# Altium schematic symbol library SCHLIB.SchLib: 2608 symbols (part 10 of 20) (continued)
## Q-MMBTA06 (continued)
footprint SOT23-3
pins: 1, 2, 3

## Q-MMBTA56LT1G
designator Q?, comment MMBTA56LT1G  Case/Package: SOT-23-3
TRANS PNP 80V 0.5A SOT23; Manufacturer: ON Semiconductor; Max Power Dissipation: 225mW; Number of Elements: 1; Frequency: 50MHz; hFE Min: 100; Emitter Base Voltage (VEBO): 4V; Max Collector Current: 500mA; Collector Emitter Breakdown Voltage: -80V; Collector Emitter Saturation Voltage: -250mV; Power Dissipation: 300mW; Element Configuration: Single; Current Rating: -500mA; Washability: OK; Supplier 1: Digi-Key; Manufacturer Part Number: MMBTA56LT1G; Stock 1: 65303; Pricing 1: 1=0.22, 10=0.203, 100=0.1106, 500=0.06806, 1000=0.0464 (USD); Number of Pins: 3; Contact Plating: Matte,Tin; Min Operating Temperature: -55°C; Max Operating Temperature: 150°C; Package Quantity: 1; Collector Emitter Voltage (VCEO): 80V; Packaging: Tape and Reel; Polarity: PNP; Transition Frequency: 50MHz; Max Breakdown Voltage: 80V; Collector Base Voltage (VCBO): 80V; Gain Bandwidth Product: 50MHz; Max Frequency: 50MHz; Voltage Rating (DC): -80V; Length: 0.119inch; Height: 0.04inch; Width: 0.055inch; Radiation Hardening: No; Lead Free: Lead Free; REACH SVHC: No SVHC; ComponentLink1URL: https://www.verical.com/server-webapp/html/getDatasheet?partID=99524; ComponentLink1Description: https://www.verical.com/server-webapp/html/getDatasheet?partID=99524; ComponentLink2URL: http://www.mouser.com/ds/2/308/MMBTA55LT1-D-112284.pdf; ComponentLink2Description: http://www.mouser.com/ds/2/308/MMBTA55LT1-D-112284.pdf; ComponentLink3URL: http://www.farnell.com/datasheets/1571910.pdf; ComponentLink3Description: http://www.farnell.com/datasheets/1571910.pdf; ComponentLink4URL: http://www.onsemi.com/pub/Collateral/MMBTA55LT1-D.PDF; ComponentLink4Description: http://www.onsemi.com/pub/Collateral/MMBTA55LT1-D.PDF; Supplier Part Number 1: MMBTA56LT1GOSDKR-ND
footprint SOT23-3
pins: 1, 2, 3

## Q-NTBLS0D7N06C
designator Q?, comment NTBLS0D7N06C
NFET TOLL 60V 0.75MO; Manufacturer: ON Semiconductor; Supplier 1: Digi-Key; Manufacturer Part Number: NTBLS0D7N06C; Stock 1: 1954; Pricing 1: 1=5,41000, 10=4,85500, 25=4,59000, 100=3,67200, 500=3,26400, 1000=2,79480 (USD); RoHS: No; Supplier 2: Digi-Key; Manufacturer Part Number 2: NTBLS0D7N06C; Stock 2: 1954; Pricing 2: 1=5,41000, 10=4,85500, 25=4,59000, 100=3,67200, 500=3,26400, 1000=2,79480 (USD); Supplier Part Number 1: 488-NTBLS0D7N06CCT-ND
footprint 8-PowerSFN
pins: 1 GATE, 2 SOURCE, 3 SOURCE, 4 SOURCE, 5 SOURCE, 6 SOURCE, 7 SOURCE, 8 SOURCE, 9 DRAIN

## Q-NTMTS0D6N04CL
designator Q?, comment NTMTS0D6N04CL
N-Channel 40V 554.5A 5W; Manufacturer: ON Semiconductor; Manufacturer Part Number: NTMTS0D6N04CLTXG; Supplier 1: Digi-Key; Stock 1: 2803; Pricing 1: 1=4,40000, 10=3,95000, 25=3,73400, 100=2,98730, 500=2,65536, 1000=2,27365 (USD); RoHS: No; Supplier Part Number 1: NTMTS0D6N04CLTXGOSCT-ND
footprint PQFN 8x8
pins: 1 G, 2 S, 3 S, 4 S, 5 D, 6 D, 7 D, 8 D

## Q-NVTFS6H850NTAG
designator Q?, comment NVTFS6H850
MOSFET N-CH 80V 68A TRENCH 8WDFN; Manufacturer: ON Semiconductor; Manufacturer Part Number: NVTFS6H850NTAG; Rds On Max: 9.5mR; Input Capacitance: 1.14nF; Max Power Dissipation: 107W; Supplier 1: Digi-Key; Supplier Part Number 1: NVTFS6H850NTAGOSCT-ND; Stock: 1154; Pricing: 1=0.93, 10=0.819, 25=0.7696, 100=0.5587, 500=0.4668 (USD); Mount: Surface Mount; Number of Pins: 8; Min Operating Temperature: -55°C; Max Operating Temperature: 175°C; Packaging: Cut Tape; Drain to Source Voltage (Vdss): 80V; Continuous Drain Current (ID): 68A; ComponentLink1URL: https://www.onsemi.com/pub/Collateral/NVTFS6H850N-D.PDF?src-supplier=Digi-Key; ComponentLink1Description: https://www.onsemi.com/pub/Collateral/NVTFS6H850N-D.PDF?src-supplier=Digi-Key; ComponentLink2URL: http://datasheet.octopart.com/NVTFS6H850NTAG-ON-Semiconductor-datasheet-139013616.pdf?src-supplier=ON+Semiconductor; ComponentLink2Description: http://datasheet.octopart.com/NVTFS6H850NTAG-ON-Semiconductor-datasheet-139013616.pdf?src-supplier=ON+Semiconductor; ComponentLink3URL: http://datasheet.octopart.com/NVTFS6H850NTAG-ON-Semiconductor-datasheet-86803066.pdf?src-supplier=ON+Semiconductor; ComponentLink3Description: http://datasheet.octopart.com/NVTFS6H850NTAG-ON-Semiconductor-datasheet-86803066.pdf?src-supplier=ON+Semiconductor; ComponentLink4URL: http://datasheet.octopart.com/NVTFS6H850NTAG-ON-Semiconductor-datasheet-101611421.pdf?src-supplier=Farnell; ComponentLink4Description: http://datasheet.octopart.com/NVTFS6H850NTAG-ON-Semiconductor-datasheet-101611421.pdf?src-supplier=Farnell
footprint 8-PowerWDFN (DFN, 8-Leads, Body 3.05x3.05mm, Pitch 0.65mm)
pins: 1 S, 2 S, 3 S, 4 G, 5 D, 6 D, 7 D, 8 D

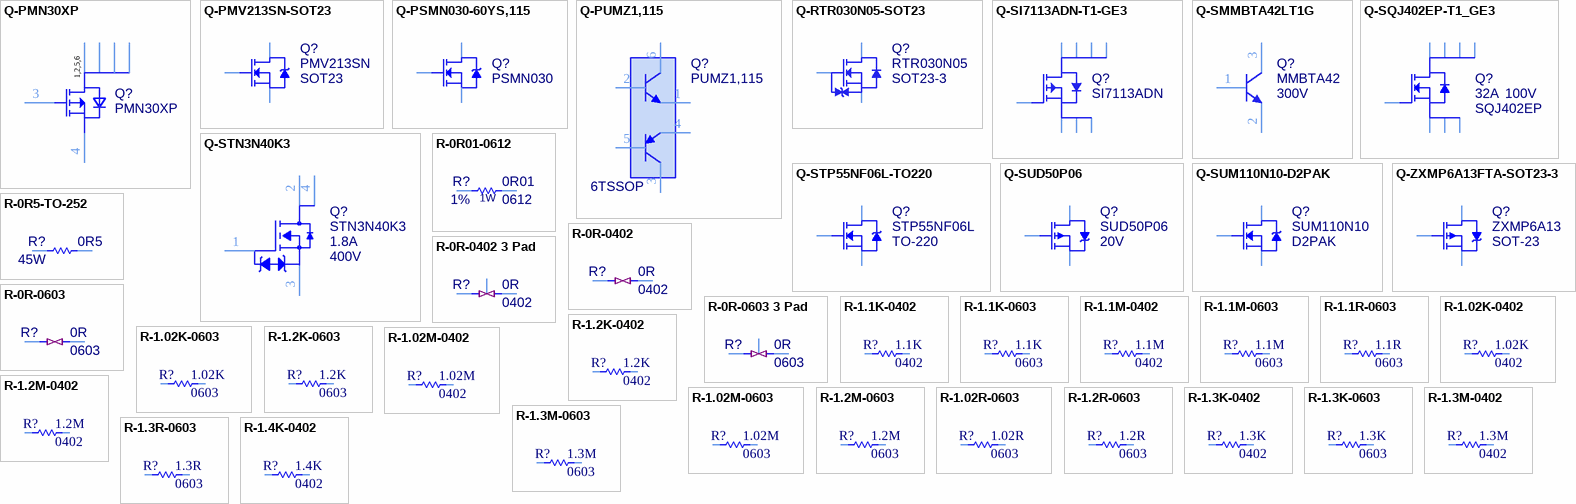
[diagram p43: symbols Q-PMN30XP to R-1.4K-0402]

## Q-PMN30XP
designator Q?, comment PMN30XP
MOSFET P-CH 20V 5.2A 6TSOP; Manufacturer: NXP Semiconductors; Manufacturer Part Number 1: PMN30XPX; Max Power Dissipation: 550mW; Rds On Max: 34mR; Input Capacitance: 1.575nF; Supplier 1: Digi-Key; Stock 1: 16739; Pricing 1: 1=0,43000, 10=0,34800, 25=0,31840, 100=0,19980, 500=0,18500, 1000=0,12580 (USD); RoHS: Yes; Mount: Surface Mount; Min Operating Temperature: -55°C; Max Operating Temperature: 150°C; Drain to Source Voltage (Vdss): 20V; Continuous Drain Current (ID): 5.2A; Packaging: Tape and Reel; ComponentLink1URL: https://assets.nexperia.com/documents/data-sheet/PMN30XP.pdf?src-supplier=Digi-Key; ComponentLink1Description: https://assets.nexperia.com/documents/data-sheet/PMN30XP.pdf?src-supplier=Digi-Key; Case/Package: TSOP; Supplier Part Number 1: 1727-2699-1-ND
footprint TSOP6
pins: 1 DRAIN, 2 DRAIN, 3 GATE, 4 SOURCE, 5 DRAIN, 6 DRAIN
text: 1,2,5,6

## Q-PMV213SN-SOT23
designator Q?, comment PMV213SN  Case/Package: SOT23
MOSFET N-CH 100V 1.9A SOT23; Manufacturer: NXP Semiconductors; Manufacturer Part Number: PMV213SN,215; Input Capacitance: 330pF; Max Power Dissipation: 2W; Rds On Max: 250mR; Rise Time: 5ns; Fall Time: 3ns; Turn-Off Delay Time: 9.5ns; Turn-On Delay Time: 5.5ns; Element Configuration: Single; Gate to Source Voltage (Vgs): 30V; Washability: OK; Supplier 1: Digi-Key; Supplier Part Number 1: 1727-6294-6-ND; Stock 1: 0; Pricing 1: 1=0.66, 10=0.557, 100=0.4181, 500=0.30658, 1000=0.23691 (USD); Number of Pins: 3; Weight: 0.01lb; Min Operating Temperature: -55°C; Max Operating Temperature: 150°C; Package Quantity: 1; Packaging: Tape and Reel; Max Dual Supply Voltage: 100V; Drain to Source Voltage (Vdss): 100V; Continuous Drain Current (ID): 1.9A; Drain to Source Breakdown Voltage: 100V; Power Dissipation: 2W; Drain to Source Resistance: 250mR; On-State Resistance: 250MR; Length: 3mm; Height: 1mm; Width: 1.4mm; Radiation Hardening: No; Lead Free: Lead Free; ComponentLink1URL: http://www.nxp.com/documents/data_sheet/PMV213SN.pdf; ComponentLink1Description: http://www.nxp.com/documents/data_sheet/PMV213SN.pdf; ComponentLink2URL: http://www.nxp.com/documents/data_sheet/PMV213SN.pdf?ecmp=mouser; ComponentLink2Description: http://www.nxp.com/documents/data_sheet/PMV213SN.pdf?ecmp=mouser
footprint SOT23-3
pins: 1 G, 2 S, 3 D

## Q-PSMN030-60YS,115
designator Q?, comment PSMN030
MOSFET N-CH 60V 29A LFPAK; Manufacturer: Nexperia; Manufacturer Part Number: PSMN030-60YS,115; Washability: OK; RoHS: No; Supplier 1: Digi-Key; Supplier Part Number 1: 1727-4628-1-ND; Stock 1: 15240; Pricing 1: 1=0.56000, 10=0.48300, 100=0.33500, 500=0.26156 (USD)
footprint SOT669-LFPAK (TDSON, 8-Leads, Body 6.15x5.15mm, Pitch 1.27mm)
pins: 1 S, 2 S, 3 S, 4 G, 5 D

## Q-PUMZ1,115
designator Q?, comment Case/Package: 6TSSOP  Manufacturer Part Number: PUMZ1,115  (hidden comment: PUMZ1)
TRANS NPN/PNP 40V 0.1A 6TSSOP; Manufacturer: NXP Semiconductors; Max Power Dissipation: 200mW; Max Collector Current: 100mA; Collector Base Voltage (VCBO): 50V; Frequency: 100MHz; Polarity: NPN; Emitter Base Voltage (VEBO): 5V; Number of Elements: 2; Test Current: 5mA; Zener Voltage: 5.1V; Element Configuration: Dual; Current: 1A; Washability: OK; Supplier 1: Digi-Key; Stock 1: 0; RoHS: Yes; Mount: Surface Mount; Number of Pins: 6; Min Operating Temperature: -65°C; Max Operating Temperature: 150°C; Collector Emitter Voltage (VCEO): 40V; Package Quantity: 1; Packaging: Tape and Reel; Transition Frequency: 100MHz; Collector Emitter Breakdown Voltage: 40V; Max Breakdown Voltage: 40V; Power Dissipation: 200mW; Termination: SMD/SMT; Gain Bandwidth Product: 100MHz; Voltage: 40V; Radiation Hardening: No; REACH SVHC: No SVHC; Lead Free: Lead Free; ComponentLink1URL: https://datasheet.ciiva.com/4722/pumz1-104831-4722227.pdf?src-supplier=Mouser; ComponentLink1Description: https://datasheet.ciiva.com/4722/pumz1-104831-4722227.pdf?src-supplier=Mouser; ComponentLink2URL: https://datasheet.ciiva.com/6366/pumz1-6366963.pdf?src-supplier=Digi-Key; ComponentLink2Description: https://datasheet.ciiva.com/6366/pumz1-6366963.pdf?src-supplier=Digi-Key; ComponentLink3URL: https://datasheet.ciiva.com/968/pumz1-968100.pdf?src-supplier=Digi-Key; ComponentLink3Description: https://datasheet.ciiva.com/968/pumz1-968100.pdf?src-supplier=Digi-Key; ComponentLink4URL: https://datasheet.ciiva.com/6366/pumz1-6366965.pdf?src-supplier=Digi-Key; ComponentLink4Description: https://datasheet.ciiva.com/6366/pumz1-6366965.pdf?src-supplier=Digi-Key; ComponentLink5URL: https://datasheet.ciiva.com/1259/pimz2-pumz2-1259478.pdf?src-supplier=Newark; ComponentLink5Description: https://datasheet.ciiva.com/1259/pimz2-pumz2-1259478.pdf?src-supplier=Newark; ComponentLink6URL: https://datasheet.ciiva.com/11201/pumz1-11201527.pdf?src-supplier=Avnet; ComponentLink6Description: https://datasheet.ciiva.com/11201/pumz1-11201527.pdf?src-supplier=Avnet; ComponentLink7URL: https://datasheet.ciiva.com/16615/pumz1-16615180.pdf?src-supplier=Avnet+Europe; ComponentLink7Description: https://datasheet.ciiva.com/16615/pumz1-16615180.pdf?src-supplier=Avnet+Europe; Supplier Part Number 1: 568-6556-1-ND
footprint TSSOP6(SOT363)
pins: 1, 2, 3, 4, 5, 6

## Q-RTR030N05-SOT23
designator Q?, comment RTR030N05  Case/Package: SOT23-3
MOSFET N-CH 45V 3A TSMT3; Manufacturer: Rohm; Manufacturer Part Number: RTR030N05TL; Rise Time: 19ns; Rds On Max: 67mR; Input Capacitance: 510pF; Max Power Dissipation: 1W; Drain to Source Resistance: 48mR; Turn-On Delay Time: 12ns; Turn-Off Delay Time: 34ns; Fall Time: 26ns; Element Configuration: Single; Gate to Source Voltage (Vgs): 12V; Washability: OK; Supplier 1: Digi-Key; Supplier Part Number 1: RTR030N05TLDKR-ND; Stock 1: 64243; Pricing 1: 1=0.61, 10=0.512, 100=0.3841, 500=0.28166, 1000=0.21765 (USD); Mount: Surface Mount; Number of Pins: 3; Min Operating Temperature: -55°C; Max Operating Temperature: 150°C; Packaging: Tape and Reel; Package Quantity: 1; Drain to Source Voltage (Vdss): 45V; Continuous Drain Current (ID): 3A; Drain to Source Breakdown Voltage: 45V; Power Dissipation: 1W; Length: 2.9mm; Height: 0.9mm; Width: 1.6mm; Radiation Hardening: No; Lead Free: Lead Free; ComponentLink1URL: http://avnetexpress.avnet.com/store/em/EMController/MOSFET/Rohm-Semiconductor/RTR030N05TL/_/R-5003358603636/A-5003358603636/rohmfs.rohm.com/en/products/databook/datasheet/discrete/transistor/mosfet/rtr030n05.pdf; ComponentLink1Description: http://avnetexpress.avnet.com/store/em/EMController/MOSFET/Rohm-Semiconductor/RTR030N05TL/_/R-5003358603636/A-5003358603636/rohmfs.rohm.com/en/products/databook/datasheet/discrete/transistor/mosfet/rtr030n05.pdf; ComponentLink2URL: http://rohmfs.rohm.com/en/products/databook/datasheet/discrete/transistor/mosfet/rtr030n05tl-e.pdf; ComponentLink2Description: http://rohmfs.rohm.com/en/products/databook/datasheet/discrete/transistor/mosfet/rtr030n05tl-e.pdf; ComponentLink3URL: http://www.mouser.com/ds/2/348/rtr030n05-208910.pdf; ComponentLink3Description: http://www.mouser.com/ds/2/348/rtr030n05-208910.pdf; ComponentLink4URL: http://datasheet.iiic.cc/rohm_semiconductor/RTR030N05TL.pdf; ComponentLink4Description: http://datasheet.iiic.cc/rohm_semiconductor/RTR030N05TL.pdf
footprint SOT23-3
pins: 1 G, 2 S, 3 D

## Q-SI7113ADN-T1-GE3
designator Q?, comment SI7113ADN
MOSFET P-CH 100V 10.8A 1212-8; Manufacturer: Vishay; Manufacturer Part Number: SI7113ADN-T1-GE3; Washability: OK; Input Capacitance: 515pF; Max Power Dissipation: 27.8W; Rds On Max: 132mR; Supplier 1: Digi-Key; Stock 1: 12735; Pricing 1: 1=0.65000, 10=0.55800, 100=0.38700, 500=0.30214, 1000=0.24559 (USD); RoHS: No; ComponentLink1URL: https://www.vishay.com/docs/77678/si7113adn.pdf?src-supplier=Digi-Key; ComponentLink1Description: https://www.vishay.com/docs/77678/si7113adn.pdf?src-supplier=Digi-Key; Supplier Part Number 1: SI7113ADN-T1-GE3CT-ND; Stock: 19112; Pricing: 1=0.63, 10=0.542, 25=0.5056, 100=0.3757, 500=0.2933, 1000=0.2384 (USD); Mount: Surface Mount; Min Operating Temperature: -55°C; Max Operating Temperature: 150°C; Packaging: Cut Tape; Drain to Source Voltage (Vdss): 100V; Continuous Drain Current (ID): 10.8A; ComponentLink2URL: http://www.farnell.com/datasheets/2687468.pdf?src-supplier=Farnell; ComponentLink2Description: http://www.farnell.com/datasheets/2687468.pdf?src-supplier=Farnell; ComponentLink3URL: http://www.farnell.com/datasheets/2687468.pdf?src-supplier=Element14; ComponentLink3Description: http://www.farnell.com/datasheets/2687468.pdf?src-supplier=Element14; ComponentLink4URL: http://www.farnell.com/datasheets/2687468.pdf?src-supplier=Newark; ComponentLink4Description: http://www.farnell.com/datasheets/2687468.pdf?src-supplier=Newark
footprint PowerPAK 1212-8
pins: 1 S, 2 S, 3 S, 4 G, 5 D, 6 D, 7 D, 8 D

## Q-SMMBTA42LT1G
designator Q?, comment MMBTA42  Collector Emitter Voltage (VCEO): 300V
TRANS NPN 300V 0.5A SOT23; Manufacturer: ON Semiconductor; Manufacturer Part Number: SMMBTA42LT1G; Frequency: 50MHz; Max Power Dissipation: 300mW; Emitter Base Voltage (VEBO): 6V; Max Collector Current: 500mA; Number of Elements: 1; Element Configuration: Single; Supplier 1: Mouser; Supplier Part Number 1: 863-SMMBTA42LT1G; Stock: 8842; Pricing: 1=0.41, 10=0.269, 100=0.119, 1000=0.088, 3000=0.071, 9000=0.061 (USD); RoHS: Yes; Case/Package: SOT-23-3; Number of Pins: 3; Contact Plating: Tin,Matte; Min Operating Temperature: -55°C; Max Operating Temperature: 150°C; Package Quantity: 3000; Packaging: Tape and Reel; Polarity: NPN; Collector Base Voltage (VCBO): 300V; Collector Emitter Breakdown Voltage: 300V; Transition Frequency: 50MHz; Power Dissipation: 300mW; Radiation Hardening: No; Lead Free: Lead Free; ComponentLink1URL: https://datasheet.ciiva.com/25997/mmbta42lt1-d-25997511.pdf?src-supplier=Avnet+Europe; ComponentLink1Description: https://datasheet.ciiva.com/25997/mmbta42lt1-d-25997511.pdf?src-supplier=Avnet+Europe; ComponentLink2URL: https://datasheet.ciiva.com/11204/mmbta42lt1-d-11204938.pdf?src-supplier=Avnet; ComponentLink2Description: https://datasheet.ciiva.com/11204/mmbta42lt1-d-11204938.pdf?src-supplier=Avnet
footprint SOT23-3
pins: 1 B, 2 E, 3 C

## Q-SQJ402EP-T1_GE3
designator Q?, comment SQJ402EP  Continuous Drain Current (ID): 32A  Drain to Source Voltage (Vdss): 100V
MOSFET N-CH 100V POWERPAK SO8L; Manufacturer: Vishay Semiconductors; Manufacturer Part Number: SQJ402EP-T1_GE3; Rise Time: 10ns; Turn-Off Delay Time: 27ns; Fall Time: 7ns; Threshold Voltage: 2V; Max Power Dissipation: 83W; Gate to Source Voltage (Vgs): 20V; Element Configuration: Single; Number of Channels: 1; Drain to Source Resistance: 11mR; Washability: OK; Supplier 1: Digi-Key; Stock 1: 4517; Pricing 1: 1=1.43000, 10=1.27600, 100=0.90850, 500=0.77002, 1000=0.62727 (USD); RoHS: Yes; Mount: Surface Mount; Number of Pins: 8; Min Operating Temperature: -55°C; Max Operating Temperature: 175°C; Packaging: Tape and Reel; Turn-On Delay Time: 10ns; Package Quantity: 3000; Length: 4.9mm; Height: 1.07mm; Width: 4.37mm; Radiation Hardening: No; REACH SVHC: Unknown; ComponentLink1URL: https://datasheet.ciiva.com/30021/sqj402ep-30021632.pdf?src-supplier=Avnet; ComponentLink1Description: https://datasheet.ciiva.com/30021/sqj402ep-30021632.pdf?src-supplier=Avnet; Supplier Part Number 1: SQJ402EP-T1_GE3CT-ND
footprint SO8L
pins: 1 S, 2 S, 3 S, 4 G, 5 D, 6 D, 7 D, 8 D

## Q-STN3N40K3
designator Q?, comment STN3N40K3  Drain to Source Breakdown Voltage: 400V  Continuous Drain Current (ID): 1.8A
MOSFET N-CH 400V 1.8A SOT223; Manufacturer: STMicroelectronics; Rise Time: 8ns; Gate to Source Voltage (Vgs): 30V; Fall Time: 14ns; Turn-On Delay Time: 7ns; Turn-Off Delay Time: 18ns; Rds On Max: 3.4R; Input Capacitance: 165pF; Max Power Dissipation: 3.3W; Number of Elements: 1; Drain to Source Resistance: 3R; Threshold Voltage: 3.75V; Element Configuration: Single; Supplier 1: Digi-Key; Supplier Part Number 1: 497-11222-1-ND; Manufacturer Part Number: STN3N40K3; Stock: 18345; Pricing: 1=0.61, 10=0.524, 25=0.4888, 100=0.3632, 250=0.345, 500=0.2836, 1000=0.2305 (USD); RoHS: Yes; Mount: Surface Mount; Case/Package: SOT-223; Number of Pins: 4; Min Operating Temperature: -55°C; Max Operating Temperature: 150°C; Package Quantity: 4000; Packaging: Tape and Reel; Drain to Source Voltage (Vdss): 400V; Power Dissipation: 3.3W; On-State Resistance: 3.4R; Length: 6.7mm; Height: 1.7mm; Width: 3.7mm; Radiation Hardening: No; Lead Free: Lead Free; REACH SVHC: No SVHC; ComponentLink1URL: https://datasheet.ciiva.com/17321/cd00278221-17321187.pdf?src-supplier=Avnet+Europe; ComponentLink1Description: https://datasheet.ciiva.com/17321/cd00278221-17321187.pdf?src-supplier=Avnet+Europe; ComponentLink2URL: https://datasheet.ciiva.com/8025/1581600-8025273.pdf?src-supplier=Element14; ComponentLink2Description: https://datasheet.ciiva.com/8025/1581600-8025273.pdf?src-supplier=Element14; ComponentLink3URL: https://datasheet.ciiva.com/4441/cd00278221-117631-4441628.pdf?src-supplier=Mouser; ComponentLink3Description: https://datasheet.ciiva.com/4441/cd00278221-117631-4441628.pdf?src-supplier=Mouser; ComponentLink4URL: https://datasheet.ciiva.com/25625/0900766b810ea1b2-25625599.pdf?src-supplier=RSComponents; ComponentLink4Description: https://datasheet.ciiva.com/25625/0900766b810ea1b2-25625599.pdf?src-supplier=RSComponents; ComponentLink5URL: https://datasheet.ciiva.com/938/cd00278221-938465.pdf?src-supplier=Digi-Key; ComponentLink5Description: https://datasheet.ciiva.com/938/cd00278221-938465.pdf?src-supplier=Digi-Key; ComponentLink6URL: https://datasheet.ciiva.com/938/cd00278221-938467.pdf?src-supplier=Digi-Key; ComponentLink6Description: https://datasheet.ciiva.com/938/cd00278221-938467.pdf?src-supplier=Digi-Key; ComponentLink7URL: https://datasheet.ciiva.com/16491/cd00278221-16491206.pdf?src-supplier=Future+Electronics; ComponentLink7Description: https://datasheet.ciiva.com/16491/cd00278221-16491206.pdf?src-supplier=Future+Electronics
footprint SOT223 (SOT,2.30mm pitch;4 pin,3.50mm W X 6.50mm L X 1.70mm H body)
pins: 1 G, 2 D, 3 S, 4 D

## Q-STP55NF06L-TO220
designator Q?, comment STP55NF06L  Case/Package: TO-220
MOSFET N-CH 60V 55A TO-220; Manufacturer: STMicroelectronics; Rds On Max: 18mR; Input Capacitance: 1.7nF; Number of Elements: 1; Max Power Dissipation: 95W; Rise Time: 100ns; Nominal Vgs: 1.7V; Fall Time: 20ns; Drain to Source Resistance: 14mR; Turn-Off Delay Time: 40ns; Element Configuration: Single; Gate to Source Voltage (Vgs): 16V; Washability: OK; Supplier 1: Digi-Key; Supplier Part Number 1: 497-6742-5-ND; Manufacturer Part Number: STP55NF06L; Stock 1: 0; Pricing 1: 1=1.73, 50=1.3946, 100=1.2551, 500=0.97616, 1000=0.80882 (USD); Mount: Through Hole; Number of Pins: 3; Weight: 0.01lb; Min Operating Temperature: -55°C; Max Operating Temperature: 175°C; Package Quantity: 50; Packaging: Rail/Tube; Drain to Source Voltage (Vdss): 60V; Continuous Drain Current (ID): 55A; Drain to Source Breakdown Voltage: 60V; Power Dissipation: 95W; Turn-On Delay Time: 20ns; Threshold Voltage: 1.7V; Voltage Rating (DC): 60V; Current Rating: 55A; On-State Resistance: 18mR; Length: 10.4mm; Height: 9.15mm; Width: 4.6mm; Radiation Hardening: No; REACH SVHC: No SVHC; Lead Free: Lead Free; ComponentLink1URL: http://www.st.com/content/ccc/resource/technical/document/datasheet/49/c5/a8/71/93/60/4f/86/CD00002690.pdf/files/CD00002690.pdf/jcr:content/translations/en.CD00002690.pdf; ComponentLink1Description: http://www.st.com/content/ccc/resource/technical/document/datasheet/49/c5/a8/71/93/60/4f/86/CD00002690.pdf/files/CD00002690.pdf/jcr:content/translations/en.CD00002690.pdf; ComponentLink2URL: http://www.farnell.com/datasheets/129279.pdf; ComponentLink2Description: http://www.farnell.com/datasheets/129279.pdf; ComponentLink3URL: http://www.st.com/web/en/resource/technical/document/datasheet/CD00002690.pdf; ComponentLink3Description: http://www.st.com/web/en/resource/technical/document/datasheet/CD00002690.pdf
footprint TO-220AB
footprint TO-220_OUTLINE
footprint TO-220AB-H
pins: 1 G, 2 D, 3 S

## Q-SUD50P06
designator Q?, comment SUD50P06  Gate to Source Voltage (Vgs): 20V
MOSFET P-CH 60V 50A TO-252; Manufacturer: Vishay Siliconix; Manufacturer Part Number: SUD50P06-15-GE3; Rds On Max: 15mR; Input Capacitance: 4.95nF; Rise Time: 70ns; Max Power Dissipation: 2.5W; Fall Time: 175ns; Threshold Voltage: -3V; Number of Elements: 1; Turn-On Delay Time: 15ns; Element Configuration: Single; Drain to Source Breakdown Voltage: -60V; Washability: OK; Supplier 1: Digi-Key; Supplier Part Number 1: SUD50P06-15-GE3DKR-ND; Stock 1: 17302; Pricing 1: 1=2.57, 10=2.319, 100=1.8637, 500=1.44958, 1000=1.20108 (USD); Mount: Surface Mount; Case/Package: DPAK; Number of Pins: 3; Weight: 0.050717oz; Contact Plating: Matte,Tin; Min Operating Temperature: -55°C; Max Operating Temperature: 150°C; Package Quantity: 1; Packaging: Tape and Reel; Drain to Source Voltage (Vdss): 60V; Continuous Drain Current (ID): 50A; Drain to Source Resistance: 15mR; Turn-Off Delay Time: 175ns; Power Dissipation: 2.5W; Number of Channels: 1; On-State Resistance: 15mR; Length: 6.73mm; Height: 2.39mm; Width: 6.22mm; Radiation Hardening: No; REACH SVHC: No SVHC; Lead Free: Lead Free; ComponentLink1URL: http://www.vishay.com/docs/68940/sud50p06.pdf?src-supplier=Digi-Key; ComponentLink1Description: http://www.vishay.com/docs/68940/sud50p06.pdf?src-supplier=Digi-Key; ComponentLink2URL: http://www.farnell.com/datasheets/2049645.pdf?src-supplier=Element14; ComponentLink2Description: http://www.farnell.com/datasheets/2049645.pdf?src-supplier=Element14; ComponentLink3URL: http://www.mouser.com/ds/2/427/sud50p06-244530.pdf?src-supplier=Mouser; ComponentLink3Description: http://www.mouser.com/ds/2/427/sud50p06-244530.pdf?src-supplier=Mouser; ComponentLink4URL: http://www.vishay.com/docs/68940/sud50p06.pdf?src-supplier=Farnell; ComponentLink4Description: http://www.vishay.com/docs/68940/sud50p06.pdf?src-supplier=Farnell; ComponentLink5URL: http://www.vishay.com/docs/68940/sud50p06.pdf?src-supplier=Avnet; ComponentLink5Description: http://www.vishay.com/docs/68940/sud50p06.pdf?src-supplier=Avnet; ComponentLink6URL: http://www.vishay.com/docs/68940/sud50p06.pdf?src-supplier=Avnet+Europe; ComponentLink6Description: http://www.vishay.com/docs/68940/sud50p06.pdf?src-supplier=Avnet+Europe; ComponentLink7URL: http://www.vishay.com/docs/68940/sud50p06.pdf?src-supplier=Future+Electronics; ComponentLink7Description: http://www.vishay.com/docs/68940/sud50p06.pdf?src-supplier=Future+Electronics; ComponentLink8URL: http://datasheet.iiic.cc/vishay_[siliconix]/SUD50P06-15-GE3.pdf?src-supplier=IIIC; ComponentLink8Description: http://datasheet.iiic.cc/vishay_[siliconix]/SUD50P06-15-GE3.pdf?src-supplier=IIIC
footprint D2PAK-TO-263
pins: 1 G, 2 S, 3 D

## Q-SUM110N10-D2PAK
designator Q?, comment SUM110N10  Case/Package: D2PAK
MOSFET N-CH 100V 110A D2PAK; Manufacturer: Vishay Siliconix; Manufacturer Part Number: SUM110N10-09-E3; Nominal Vgs: 4V; Rds On Max: 9.5mR; Input Capacitance: 6.7nF; Rise Time: 125ns; Max Power Dissipation: 3.75W; Gate to Source Voltage (Vgs): 20V; Fall Time: 130ns; Turn-Off Delay Time: 55ns; Turn-On Delay Time: 20ns; Number of Elements: 1; Reverse Recovery Time: 70ns; Element Configuration: Single; Washability: OK; Supplier 1: Digi-Key; Supplier Part Number 1: SUM110N10-09-E3DKR-ND; Stock 1: 11942; Pricing 1: 1=3.67, 10=3.279, 100=2.6892 (USD); Mount: Surface Mount; Number of Pins: 3; Weight: 0.050717oz; Min Operating Temperature: -55°C; Max Operating Temperature: 175°C; Package Quantity: 800; Packaging: Tape and Reel; Dual Supply Voltage: 100V; Drain to Source Voltage (Vdss): 100V; Continuous Drain Current (ID): 110A; Drain to Source Breakdown Voltage: 100V; Drain to Source Resistance: 9.5mR; Threshold Voltage: 4V; Power Dissipation: 3.75W; Termination: SMD/SMT; Number of Channels: 1; On-State Resistance: 9.5MR; Length: 10.41mm; Height: 4.83mm; Width: 9.65mm; Radiation Hardening: No; REACH SVHC: Unknown; Lead Free: Lead Free; ComponentLink1URL: http://www.vishay.com/docs/70677/sum110n1.pdf; ComponentLink1Description: http://www.vishay.com/docs/70677/sum110n1.pdf; ComponentLink2URL: http://www.farnell.com/datasheets/492045.pdf; ComponentLink2Description: http://www.farnell.com/datasheets/492045.pdf
footprint D2PAK-TO-263
pins: 1 G, 2 S, 3 D

## Q-ZXMP6A13FTA-SOT23-3
designator Q?, comment ZXMP6A13  Case/Package: SOT-23
MOSFET P-CH 60V 0.9A SOT23-3; Manufacturer: Diodes Zetex; Manufacturer Part Number: ZXMP6A13FTA; Input Capacitance: 219pF; Number of Elements: 1; Max Power Dissipation: 625mW; Rise Time: 2.2ns; Rds On Max: 400mR; Drain to Source Resistance: 600mR; Gate to Source Voltage (Vgs): 20V; Fall Time: 5.7ns; Turn-Off Delay Time: 11.2ns; Turn-On Delay Time: 1.6ns; Drain to Source Voltage (Vdss): -60V; Continuous Drain Current (ID): 1.1A; Threshold Voltage: -3V; Power Dissipation: 806mW; Element Configuration: Single; Current Rating: -1.1A; Washability: OK; Supplier 1: Digi-Key; Supplier Part Number 1: ZXMP6A13FDKR-ND; Stock 1: 261434; Pricing 1: 1=0.65, 10=0.544, 100=0.4079, 500=0.29912, 1000=0.23113 (USD); Mount: Surface Mount; Number of Pins: 3; Weight: 0.000282oz; Contact Plating: Matte,Tin; Min Operating Temperature: -55°C; Max Operating Temperature: 150°C; Packaging: Tape and Reel; Package Quantity: 3000; Number of Channels: 1; On-State Resistance: 600mR; Voltage Rating (DC): -60V; Length: 3.04mm; Height: 1.02mm; Width: 1.4mm; Radiation Hardening: No; REACH SVHC: No SVHC; Lead Free: Lead Free; ComponentLink1URL: http://www.farnell.com/datasheets/1915640.pdf; ComponentLink1Description: http://www.farnell.com/datasheets/1915640.pdf; ComponentLink2URL: http://docs-europe.electrocomponents.com/webdocs/0d2e/0900766b80d2efb2.pdf; ComponentLink2Description: http://docs-europe.electrocomponents.com/webdocs/0d2e/0900766b80d2efb2.pdf; ComponentLink3URL: http://www.diodes.com/datasheets/ZXMP6A13F.pdf; ComponentLink3Description: http://www.diodes.com/datasheets/ZXMP6A13F.pdf; ComponentLink4URL: http://www.mouser.com/ds/2/115/ZXMP6A13F-77652.pdf; ComponentLink4Description: http://www.mouser.com/ds/2/115/ZXMP6A13F-77652.pdf; Supplier 2: Digi-Key; Supplier Part Number 2: SUD50P06-15-GE3DKR-ND; Stock 2: 17302; Pricing 2: 1=2.57, 10=2.319, 100=1.8637, 500=1.44958, 1000=1.20108 (USD); Drain to Source Breakdown Voltage: -60V; ComponentLink5URL: http://www.vishay.com/docs/68940/sud50p06.pdf?src-supplier=Digi-Key; ComponentLink5Description: http://www.vishay.com/docs/68940/sud50p06.pdf?src-supplier=Digi-Key; ComponentLink6URL: http://www.farnell.com/datasheets/2049645.pdf?src-supplier=Element14; ComponentLink6Description: http://www.farnell.com/datasheets/2049645.pdf?src-supplier=Element14; ComponentLink7URL: http://www.mouser.com/ds/2/427/sud50p06-244530.pdf?src-supplier=Mouser; ComponentLink7Description: http://www.mouser.com/ds/2/427/sud50p06-244530.pdf?src-supplier=Mouser; ComponentLink8URL: http://www.vishay.com/docs/68940/sud50p06.pdf?src-supplier=Farnell; ComponentLink8Description: http://www.vishay.com/docs/68940/sud50p06.pdf?src-supplier=Farnell; ComponentLink9URL: http://www.vishay.com/docs/68940/sud50p06.pdf?src-supplier=Avnet; ComponentLink9Description: http://www.vishay.com/docs/68940/sud50p06.pdf?src-supplier=Avnet; ComponentLink10URL: http://www.vishay.com/docs/68940/sud50p06.pdf?src-supplier=Avnet+Europe; ComponentLink10Description: http://www.vishay.com/docs/68940/sud50p06.pdf?src-supplier=Avnet+Europe; ComponentLink11URL: http://www.vishay.com/docs/68940/sud50p06.pdf?src-supplier=Future+Electronics; ComponentLink11Description: http://www.vishay.com/docs/68940/sud50p06.pdf?src-supplier=Future+Electronics; ComponentLink12URL: http://datasheet.iiic.cc/vishay_[siliconix]/SUD50P06-15-GE3.pdf?src-supplier=IIIC; ComponentLink12Description: http://datasheet.iiic.cc/vishay_[siliconix]/SUD50P06-15-GE3.pdf?src-supplier=IIIC; RoHS: No
footprint SOT23-3
pins: 1 G, 2 S, 3 D

## R-0R01-0612
designator R?, comment 0R01  Tolerance: 1%  Power Rating: 1W  Case Code (Imperial): 0612
RES 0.01 OHM 1W 1206 WIDE; Manufacturer: Panasonic; Manufacturer Part Number: ERJ-B2CFR01V; Resistance: 10mR; Temperature Coefficient: 300ppm/°C; Voltage Rating: 200V; Washability: OK; Supplier 1: Digi-Key; Stock 1: 0; Pricing 1: 5000=0.08296 (USD); RoHS: Yes; Mount: Surface Mount; Case/Package: 1206; Contact Plating: Tin; Case Code (Metric): 1632; Min Operating Temperature: -55°C; Max Operating Temperature: 155°C; Composition: Thick Film; Packaging: Tape and Reel; Package Quantity: 5000; Number of Terminations: 2; Termination: SMD/SMT; Military Standard: Not; Max Power Dissipation: 1W; Voltage Rating (DC): 200V; Length: 1.6mm; Height: 0.031inch; Width: 0.126inch; Depth: 3.2mm; Radiation Hardening: No; REACH SVHC: Unknown; Lead Free: Lead Free; ComponentLink1URL: https://datasheet.ciiva.com/17212/aoa0000ce23-17212038.pdf?src-supplier=Avnet+Europe; ComponentLink1Description: https://datasheet.ciiva.com/17212/aoa0000ce23-17212038.pdf?src-supplier=Avnet+Europe; ComponentLink2URL: https://datasheet.ciiva.com/46437/1497268-46437047.pdf?src-supplier=Element14; ComponentLink2Description: https://datasheet.ciiva.com/46437/1497268-46437047.pdf?src-supplier=Element14; ComponentLink3URL: https://datasheet.ciiva.com/24065/aoa0000ce23-72160-24065449.pdf?src-supplier=Mouser; ComponentLink3Description: https://datasheet.ciiva.com/24065/aoa0000ce23-72160-24065449.pdf?src-supplier=Mouser; ComponentLink4URL: https://datasheet.ciiva.com/9194/aoa0000ce23-9194127.pdf?src-supplier=Avnet; ComponentLink4Description: https://datasheet.ciiva.com/9194/aoa0000ce23-9194127.pdf?src-supplier=Avnet; Supplier Part Number 1: ERJ-B2CFR01V-ND
footprint R-0612 (Chip Resistor, 2-Leads, Body 1,60x3,20mm, IPC Medium Density)
pins: 1, 2

## R-0R5-TO-252
designator R?, comment 0R5  Max Power Dissipation: 45W
RES 0.5 OHM 5% 45W PFC10; Manufacturer: Ohmite; Manufacturer Part Number: TKH45PR500JE-TR; Resistance: 500mR; Temperature Coefficient: 100ppm/°C; Supplier 1: Digi-Key; Supplier Part Number 1: TKH45PR500JECT-ND; Stock: 810; Pricing: 1=2.29, 10=2.035, 100=1.554 (USD); RoHS: No; Case/Package: SMD/SMT; Min Operating Temperature: -55°C; Max Operating Temperature: 175°C; Resistor Type: Thick Film; Packaging: Cut Tape; Tolerance: 5%; Number of Terminations: 2; ComponentLink1URL: http://www.ohmite.com/assets/docs/res_tkh.pdf?r=false&src-supplier=Digi-Key; ComponentLink1Description: http://www.ohmite.com/assets/docs/res_tkh.pdf?r=false&src-supplier=Digi-Key
footprint R-TO-252
pins: 1, 2

## R-0R-0402
designator R?, comment 0R  Case Code (Imperial): 0402
RES SMD 0 OHM JUMPER 1/16W 0402; Manufacturer: Royal Electronic Factory; Manufacturer Part Number: 0402WGJ0000TCE; Resistance: 0mR; Max Power Dissipation: 63mW; Power Rating: 62.5mW; Tolerance: 5%; Voltage Rating: 50V; Temperature Coefficient: 200ppm/°C; Washability: OK; ComponentLink1URL: http://www.vishay.com/docs/20035/dcrcwe3.pdf; ComponentLink1Description: http://www.vishay.com/docs/20035/dcrcwe3.pdf; ComponentLink2URL: http://www.farnell.com/datasheets/2111203.pdf; ComponentLink2Description: http://www.farnell.com/datasheets/2111203.pdf; ComponentLink3URL: http://www.farnell.com/datasheets/2045673.pdf; ComponentLink3Description: http://www.farnell.com/datasheets/2045673.pdf; ComponentLink4URL: https://www.distrelec.biz/Web/Downloads/a_/en/flD-CRCW-e3_data_en.pdf?mime=application%2Fpdf; ComponentLink4Description: https://www.distrelec.biz/Web/Downloads/a_/en/flD-CRCW-e3_data_en.pdf?mime=application%2Fpdf; ComponentLink5URL: http://datasheet.octopart.com/CRCW04020000Z0ED-Vishay-datasheet-14722531.pdf; ComponentLink5Description: http://datasheet.octopart.com/CRCW04020000Z0ED-Vishay-datasheet-14722531.pdf; ComponentLink6URL: http://datasheet.octopart.com/CRCW04020000Z0ED-Vishay-datasheet-83961561.pdf; ComponentLink6Description: http://datasheet.octopart.com/CRCW04020000Z0ED-Vishay-datasheet-83961561.pdf; ComponentLink7URL: http://datasheet.octopart.com/CRCW04020000Z0ED-Vishay-datasheet-16179825.pdf; ComponentLink7Description: http://datasheet.octopart.com/CRCW04020000Z0ED-Vishay-datasheet-16179825.pdf; ComponentLink8URL: http://datasheet.octopart.com/CRCW04020000Z0ED-Vishay-datasheet-62317933.pdf; ComponentLink8Description: http://datasheet.octopart.com/CRCW04020000Z0ED-Vishay-datasheet-62317933.pdf; ComponentLink9URL: http://datasheet.octopart.com/CRCW04020000Z0ED-Vishay-datasheet-5300368.pdf; ComponentLink9Description: http://datasheet.octopart.com/CRCW04020000Z0ED-Vishay-datasheet-5300368.pdf; ComponentLink10URL: http://datasheet.octopart.com/CRCW04020000Z0ED-Vishay-datasheet-5306405.pdf; ComponentLink10Description: http://datasheet.octopart.com/CRCW04020000Z0ED-Vishay-datasheet-5306405.pdf; ComponentLink11URL: http://datasheet.octopart.com/CRCW04020000Z0ED-Vishay-datasheet-11516975.pdf; ComponentLink11Description: http://datasheet.octopart.com/CRCW04020000Z0ED-Vishay-datasheet-11516975.pdf; ComponentLink12URL: http://datasheet.octopart.com/CRCW04020000Z0ED-Vishay-datasheet-17599201.pdf; ComponentLink12Description: http://datasheet.octopart.com/CRCW04020000Z0ED-Vishay-datasheet-17599201.pdf; ComponentLink13URL: http://datasheet.octopart.com/CRCW04020000Z0ED-Vishay-datasheet-41302739.pdf; ComponentLink13Description: http://datasheet.octopart.com/CRCW04020000Z0ED-Vishay-datasheet-41302739.pdf; ComponentLink14URL: http://datasheet.octopart.com/CRCW04020000Z0ED-Vishay-datasheet-27121962.pdf; ComponentLink14Description: http://datasheet.octopart.com/CRCW04020000Z0ED-Vishay-datasheet-27121962.pdf; ComponentLink15URL: http://datasheet.octopart.com/CRCW04020000Z0ED-Vishay-datasheet-66077789.pdf; ComponentLink15Description: http://datasheet.octopart.com/CRCW04020000Z0ED-Vishay-datasheet-66077789.pdf; ComponentLink16URL: http://datasheet.octopart.com/CRCW04020000Z0ED-Vishay-datasheet-42367.pdf; ComponentLink16Description: http://datasheet.octopart.com/CRCW04020000Z0ED-Vishay-datasheet-42367.pdf; ComponentLink17URL: http://datasheet.octopart.com/CRCW04020000Z0ED-Vishay-datasheet-148188.pdf; ComponentLink17Description: http://datasheet.octopart.com/CRCW04020000Z0ED-Vishay-datasheet-148188.pdf; ComponentLink18URL: http://datasheet.octopart.com/CRCW04020000Z0ED-Vishay-datasheet-5377255.pdf; ComponentLink18Description: http://datasheet.octopart.com/CRCW04020000Z0ED-Vishay-datasheet-5377255.pdf; ComponentLink19URL: http://datasheet.octopart.com/CRCW04020000Z0ED-Vishay-datasheet-8619608.pdf; ComponentLink19Description: http://datasheet.octopart.com/CRCW04020000Z0ED-Vishay-datasheet-8619608.pdf; ComponentLink20URL: http://datasheet.octopart.com/CRCW04020000Z0ED-Vishay-datasheet-11540273.pdf; ComponentLink20Description: http://datasheet.octopart.com/CRCW04020000Z0ED-Vishay-datasheet-11540273.pdf; ComponentLink21URL: http://datasheet.octopart.com/CRCW04020000Z0ED-Vishay-datasheet-12001583.pdf; ComponentLink21Description: http://datasheet.octopart.com/CRCW04020000Z0ED-Vishay-datasheet-12001583.pdf; ComponentLink22URL: http://datasheet.octopart.com/CRCW04020000Z0ED-Vishay-datasheet-546287.pdf; ComponentLink22Description: http://datasheet.octopart.com/CRCW04020000Z0ED-Vishay-datasheet-546287.pdf; ComponentLink23URL: http://datasheet.octopart.com/CRCW04020000Z0ED-Vishay-datasheet-8361388.pdf; ComponentLink23Description: http://datasheet.octopart.com/CRCW04020000Z0ED-Vishay-datasheet-8361388.pdf; ComponentLink24URL: http://datasheet.octopart.com/CRCW04020000Z0ED-Vishay-datasheet-8788789.pdf; ComponentLink24Description: http://datasheet.octopart.com/CRCW04020000Z0ED-Vishay-datasheet-8788789.pdf; ComponentLink25URL: http://datasheet.octopart.com/CRCW04020000Z0ED-Vishay-datasheet-10322335.pdf; ComponentLink25Description: http://datasheet.octopart.com/CRCW04020000Z0ED-Vishay-datasheet-10322335.pdf; ComponentLink26URL: http://datasheet.octopart.com/CRCW04020000Z0ED-Vishay-datasheet-12509762.pdf; ComponentLink26Description: http://datasheet.octopart.com/CRCW04020000Z0ED-Vishay-datasheet-12509762.pdf; ComponentLink27URL: http://datasheet.octopart.com/CRCW04020000Z0ED-Vishay-datasheet-12517896.pdf; ComponentLink27Description: http://datasheet.octopart.com/CRCW04020000Z0ED-Vishay-datasheet-12517896.pdf; ComponentLink28URL: http://datasheet.octopart.com/CRCW04020000Z0ED-Vishay-datasheet-12532161.pdf; ComponentLink28Description: http://datasheet.octopart.com/CRCW04020000Z0ED-Vishay-datasheet-12532161.pdf; ComponentLink29URL: http://datasheet.octopart.com/CRCW04020000Z0ED-Vishay-datasheet-12600034.pdf; ComponentLink29Description: http://datasheet.octopart.com/CRCW04020000Z0ED-Vishay-datasheet-12600034.pdf; ComponentLink30URL: http://datasheet.octopart.com/CRCW04020000Z0ED-Vishay-datasheet-13034211.pdf; ComponentLink30Description: http://datasheet.octopart.com/CRCW04020000Z0ED-Vishay-datasheet-13034211.pdf; ComponentLink31URL: http://datasheet.octopart.com/CRCW04020000Z0ED-Vishay-datasheet-13195083.pdf; ComponentLink31Description: http://datasheet.octopart.com/CRCW04020000Z0ED-Vishay-datasheet-13195083.pdf; ComponentLink32URL: http://datasheet.octopart.com/CRCW04020000Z0ED-Vishay-datasheet-13242068.pdf; ComponentLink32Description: http://datasheet.octopart.com/CRCW04020000Z0ED-Vishay-datasheet-13242068.pdf; ComponentLink33URL: http://datasheet.octopart.com/CRCW04020000Z0ED-Vishay-datasheet-14190200.pdf; ComponentLink33Description: http://datasheet.octopart.com/CRCW04020000Z0ED-Vishay-datasheet-14190200.pdf; ComponentLink34URL: http://datasheet.octopart.com/CRCW04020000Z0ED-Vishay-Dale-datasheet-38056517.pdf; ComponentLink34Description: http://datasheet.octopart.com/CRCW04020000Z0ED-Vishay-Dale-datasheet-38056517.pdf; ComponentLink35URL: http://datasheet.octopart.com/CRCW04020000Z0ED-Vishay-Dale-datasheet-47688880.pdf; ComponentLink35Description: http://datasheet.octopart.com/CRCW04020000Z0ED-Vishay-Dale-datasheet-47688880.pdf; ComponentLink36URL: http://datasheet.octopart.com/D-CRCW-e3-Standard-Thick-Film-Chip-Resistors-Vishay-datasheet-family-64.pdf; ComponentLink36Description: http://datasheet.octopart.com/D-CRCW-e3-Standard-Thick-Film-Chip-Resistors-Vishay-datasheet-family-64.pdf; Stock 1: 3532500; Pricing 1: 100=0.0089, 1000=0.0025, 10000=0.0013, 50000=0.00115, 250000=0.00105 (USD); Stock 2: 29923308; Pricing 2: 1=0.1, 10=0.014, 25=0.01, 50=0.0078, 100=0.0057, 250=0.00436, 500=0.00348, 1000=0.00257, 5000=0.00184 (USD); Case/Package: 0402; Case Code (Metric): 1005; Contact Plating: Matte,Tin; Min Operating Temperature: -55°C; Max Operating Temperature: 155°C; Packaging: Tape and Reel; Composition: Thick Film; Package Quantity: 1; Number of Terminations: 2; Termination: SMD/SMT; Features: Moisture Resistant; Military Standard: Not; Length: 1mm; Height: 0.016inch; Width: 0.02inch; Depth: 0.5mm; Radiation Hardening: No; Lead Free: Lead Free; REACH SVHC: Unknown; ComponentLink37URL: http://www.yageo.com/documents/recent/PYu-RC_Group_51_RoHS_L_9.pdf; ComponentLink37Description: http://www.yageo.com/documents/recent/PYu-RC_Group_51_RoHS_L_9.pdf; ComponentLink38URL: http://www.yageo.com/documents/recent/PYu-RC0402_51_RoHS_L_6.pdf; ComponentLink38Description: http://www.yageo.com/documents/recent/PYu-RC0402_51_RoHS_L_6.pdf; ComponentLink39URL: http://www.farnell.com/datasheets/1018594.pdf; ComponentLink39Description: http://www.farnell.com/datasheets/1018594.pdf; ComponentLink40URL: https://www.verical.com/server-webapp/html/getDatasheet?partID=326379; ComponentLink40Description: https://www.verical.com/server-webapp/html/getDatasheet?partID=326379; ComponentLink41URL: http://www.farnell.com/datasheets/2167052.pdf; ComponentLink41Description: http://www.farnell.com/datasheets/2167052.pdf; Mount: Surface Mount; Weight: 2.3E-05oz; Voltage Rating (DC): 50V; Stock 3: 70631880; Pricing 3: 1=0.1, 10=0.03, 25=0.0216, 50=0.0164, 100=0.0121, 250=0.00924, 500=0.0074, 1000=0.00545, 5000=0.00391 (USD); ComponentLink42URL: http://industrial.panasonic.com/www-data/pdf/AOA0000/AOA0000CE1.pdf; ComponentLink42Description: http://industrial.panasonic.com/www-data/pdf/AOA0000/AOA0000CE1.pdf; ComponentLink43URL: http://www.alliedelec.com/m/d/51cd0790071e1666bdb9d00c57fcf960.pdf; ComponentLink43Description: http://www.alliedelec.com/m/d/51cd0790071e1666bdb9d00c57fcf960.pdf; ComponentLink44URL: http://www.farnell.com/datasheets/2059623.pdf; ComponentLink44Description: http://www.farnell.com/datasheets/2059623.pdf; ComponentLink45URL: http://www.farnell.com/datasheets/1678796.pdf; ComponentLink45Description: http://www.farnell.com/datasheets/1678796.pdf; Supplier 1: Digi-Key; Supplier Part Number 1: 311-0.0JRDKR-ND